# Altium schematic symbol library SignalCommunications.SCHLIB: 804 symbols (part 1 of 9)
Pins are listed as number, name and electrical type; pins without a type are passive.

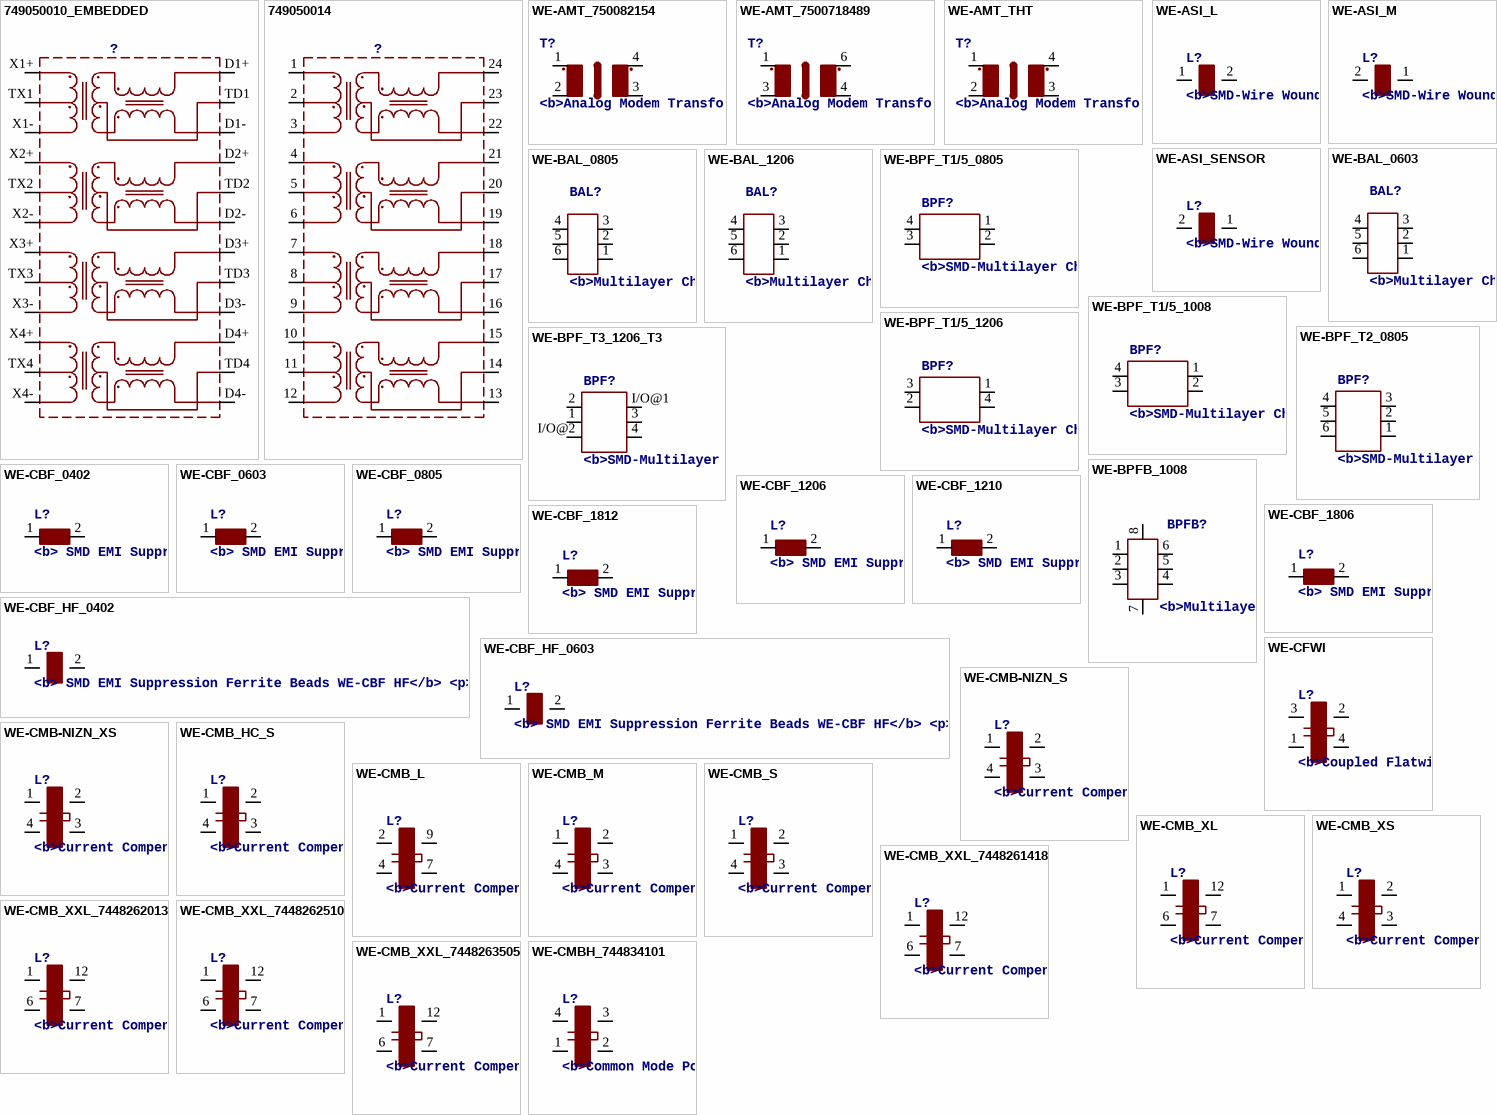
[diagram p0: symbols 749050010_EMBEDDED to WE-CMBH_744834101]

## 749050010_EMBEDDED
designator ?
pins: D1+, D1-, D2+, D2-, D3+, D3-, D4+, D4-, TD1, TD2, TD3, TD4, TX1, TX2, TX3, TX4, X1+, X1-, X2+, X2-, X3+, X3-, X4+, X4-

## 749050014
designator ?
footprint 749050010_A
pins: 1 X1+, 2 TX1, 3 X1-, 4 X2+, 5 TX2, 6 X2-, 7 X3+, 8 TX3, 9 X3-, 10 X4+, 11 TX4, 12 X4-, 13 D4-, 14 TD4, 15 D4+, 16 D3-, 17 TD3, 18 D3+, 19 D2-, 20 TD2, 21 D2+, 22 D1-, 23 TD1, 24 D1+

## WE-AMT_750082154
designator T?, comment <b>Analog Modem Transformer WE-AMT</b><p> / - SMD and THT<br> / - Small size<br> / - Flat profile<br> / - V.90 performance (SmartDAA TM)<br> / - Released for Conexant SmartDAA TM solution<br><br> / -- Analog Modems
footprint WE-AMT_750082154
pins: 1, 2 3, 3 4, 4 6

## WE-AMT_7500718489
designator T?, comment <b>Analog Modem Transformer WE-AMT</b><p> / - SMD and THT<br> / - Small size<br> / - Flat profile<br> / - V.90 performance (SmartDAA TM)<br> / - Released for Conexant SmartDAA TM solution<br><br> / -- Analog Modems
footprint WE-AMT_7500718489
pins: 1, 3, 4, 6

## WE-AMT_THT
designator T?, comment <b>Analog Modem Transformer WE-AMT</b><p> / - SMD and THT<br> / - Small size<br> / - Flat profile<br> / - V.90 performance (SmartDAA TM)<br> / - Released for Conexant SmartDAA TM solution<br><br> / -- Analog Modems
footprint WE-AMT_750082107_750082111_7500718001
pins: 1, 2 3, 3 4, 4 6

## WE-ASI_L
designator L?, comment <b>SMD-Wire Wound Inductor WE-ASI</b><p> / - Specially constructed for sensors and actuators<br> / - Highest possible current in the smallest case size<br> / - High self resonant frequency<br><br> / -- Especially designed for Automation Standard Interface applications
footprint WE-ASI_L
pins: 1, 2

## WE-ASI_M
designator L?, comment <b>SMD-Wire Wound Inductor WE-ASI</b><p> / - Specially constructed for sensors and actuators<br> / - Highest possible current in the smallest case size<br> / - High self resonant frequency<br><br> / -- Especially designed for Automation Standard Interface applications
footprint WE-ASI_M
pins: 1 2, 2 1

## WE-ASI_SENSOR
designator L?, comment <b>SMD-Wire Wound Inductor WE-ASI</b><p> / - Specially constructed for sensors and actuators<br> / - Highest possible current in the smallest case size<br> / - High self resonant frequency<br><br> / -- Especially designed for Automation Standard Interface applications
footprint WE-ASI_SENSOR
pins: 1 2, 2 1

## WE-BAL_0603
designator BAL?, comment <b>Multilayer Chip Baluns WE-BAL</b><p> / - Low loss SMD Balun with balanced impedance of 50 to 200 Ohm<br> / - Operating temperature: -40°C to +85°C<br> / - Power Capacity: 3 W max.<br><br> / -- RF-applications in the area of 0.8 to 6 GHz<br> / -- Download S-Parameter on www.we-online.com<br> / -- Wireless communication systems like DECT, PACS, PHS, GSM, WLAN, Bluetooth
footprint WE-BAL_0603
pins: 1, 2, 3, 4, 5, 6

## WE-BAL_0805
designator BAL?, comment <b>Multilayer Chip Baluns WE-BAL</b><p> / - Low loss SMD Balun with balanced impedance of 50 to 200 Ohm<br> / - Operating temperature: -40°C to +85°C<br> / - Power Capacity: 3 W max.<br><br> / -- RF-applications in the area of 0.8 to 6 GHz<br> / -- Download S-Parameter on www.we-online.com<br> / -- Wireless communication systems like DECT, PACS, PHS, GSM, WLAN, Bluetooth
footprint WE-BAL_0805
pins: 1, 2, 3, 4, 5, 6

## WE-BAL_1206
designator BAL?, comment <b>Multilayer Chip Baluns WE-BAL</b><p> / - Low loss SMD Balun with balanced impedance of 50 to 200 Ohm<br> / - Operating temperature: -40°C to +85°C<br> / - Power Capacity: 3 W max.<br><br> / -- RF-applications in the area of 0.8 to 6 GHz<br> / -- Download S-Parameter on www.we-online.com<br> / -- Wireless communication systems like DECT, PACS, PHS, GSM, WLAN, Bluetooth
footprint WE-BAL_1206
pins: 1, 2, 3, 4, 5, 6

## WE-BPF_T1/5_0805
designator BPF?, comment <b>SMD-Multilayer Chip Band-Pass Filter WE-BPF</b><p> / - low insertion loss<br> / - High attenuation<br> / - Guaranteed filter characteristics over a wide temperature range<p> / -- Rf applications in the frequency range up to 6GHz<br> / -- Wireless communcation systems like DECT, PACS, PHS, GSM,WLAN,Bluetooth,..
footprint WE-BPF_0805_T1
pins: 1 GND, 2 OUT, 3 GND, 4 IN

## WE-BPF_T1/5_1008
designator BPF?, comment <b>SMD-Multilayer Chip Band-Pass Filter WE-BPF</b><p> / - low insertion loss<br> / - High attenuation<br> / - Guaranteed filter characteristics over a wide temperature range<p> / -- Rf applications in the frequency range up to 6GHz<br> / -- Wireless communcation systems like DECT, PACS, PHS, GSM,WLAN,Bluetooth,..
footprint WE-BPF_1008_T5
pins: 1 GND, 2 OUT, 3 GND, 4 IN

## WE-BPF_T1/5_1206
designator BPF?, comment <b>SMD-Multilayer Chip Band-Pass Filter WE-BPF</b><p> / - low insertion loss<br> / - High attenuation<br> / - Guaranteed filter characteristics over a wide temperature range<p> / -- Rf applications in the frequency range up to 6GHz<br> / -- Wireless communcation systems like DECT, PACS, PHS, GSM,WLAN,Bluetooth,..
footprint WE-BPF_1206_T1
pins: 1 GND, 2 GND, 3 IN, 4 OUT

## WE-BPF_T2_0805
designator BPF?, comment <b>SMD-Multilayer Chip Band-Pass Filter WE-BPF</b><p> / - low insertion loss<br> / - High attenuation<br> / - Guaranteed filter characteristics over a wide temperature range<p> / -- Rf applications in the frequency range up to 6GHz<br> / -- Wireless communcation systems like DECT, PACS, PHS, GSM,WLAN,Bluetooth,..
footprint WE-BPF_0805_T2
pins: 1 GND, 2 GND, 3 I/O, 4 GND, 5 GND, 6 I/O

## WE-BPF_T3_1206_T3
designator BPF?, comment <b>SMD-Multilayer Chip Band-Pass Filter WE-BPF</b><p> / - low insertion loss<br> / - High attenuation<br> / - Guaranteed filter characteristics over a wide temperature range<p> / -- Rf applications in the frequency range up to 6GHz<br> / -- Wireless communcation systems like DECT, PACS, PHS, GSM,WLAN,Bluetooth,..
footprint WE-BPF_1206_T3
pins: 1 GND, 2 GND, 3 GND, 4 GND, I/O@1 I/O, I/O@2 I/O

## WE-BPFB_1008
designator BPFB?, comment <b>Multilayer SMD Band-Pass Filter with Balun WE-BPFB</b><br> / <br> / - Low insertion loss<br> / - High attenuation in the stop zone<br> / - Impedance ration 50:100<br> / - Power capacity: 1 W max.<br> / - Operating temperature: -40°C up to +85°C<br><br> / -- 2,4 GHz WLAN<br> / -- Home RF<br> / -- Bluetooth
footprint WE-BPFB_1008
pins: 1 NC, 2 UNBAL.P, 3 NC/DC, 4 BAL.P, 5 NC, 6 BAL.P, 7 GND, 8 GND

## WE-CBF_0402
designator L?, comment <b> SMD EMI Suppression Ferrite Beads WE-CBF</b> <p> / - Excellent anti-EMI properties <br> / - Low DC-restistance <br> / - Impedances till 3000 ohms <br> / - Rated current up to 6 A<p> / -- Reliable Ni-Sn electrodes<br> / -- Perfect as data lined filter and for uncoupling of distribution voltage<br>
footprint 0402
pins: 1, 2

## WE-CBF_0603
designator L?, comment <b> SMD EMI Suppression Ferrite Beads WE-CBF</b> <p> / - Excellent anti-EMI properties <br> / - Low DC-restistance <br> / - Impedances till 3000 ohms <br> / - Rated current up to 6 A<p> / -- Reliable Ni-Sn electrodes<br> / -- Perfect as data lined filter and for uncoupling of distribution voltage<br>
footprint 0603
pins: 1, 2

## WE-CBF_0805
designator L?, comment <b> SMD EMI Suppression Ferrite Beads WE-CBF</b> <p> / - Excellent anti-EMI properties <br> / - Low DC-restistance <br> / - Impedances till 3000 ohms <br> / - Rated current up to 6 A<p> / -- Reliable Ni-Sn electrodes<br> / -- Perfect as data lined filter and for uncoupling of distribution voltage<br>
footprint 0805
pins: 1, 2

## WE-CBF_1206
designator L?, comment <b> SMD EMI Suppression Ferrite Beads WE-CBF</b> <p> / - Excellent anti-EMI properties <br> / - Low DC-restistance <br> / - Impedances till 3000 ohms <br> / - Rated current up to 6 A<p> / -- Reliable Ni-Sn electrodes<br> / -- Perfect as data lined filter and for uncoupling of distribution voltage<br>
footprint 1206
pins: 1, 2

## WE-CBF_1210
designator L?, comment <b> SMD EMI Suppression Ferrite Beads WE-CBF</b> <p> / - Excellent anti-EMI properties <br> / - Low DC-restistance <br> / - Impedances till 3000 ohms <br> / - Rated current up to 6 A<p> / -- Reliable Ni-Sn electrodes<br> / -- Perfect as data lined filter and for uncoupling of distribution voltage<br>
footprint 1210
pins: 1, 2

## WE-CBF_1806
designator L?, comment <b> SMD EMI Suppression Ferrite Beads WE-CBF</b> <p> / - Excellent anti-EMI properties <br> / - Low DC-restistance <br> / - Impedances till 3000 ohms <br> / - Rated current up to 6 A<p> / -- Reliable Ni-Sn electrodes<br> / -- Perfect as data lined filter and for uncoupling of distribution voltage<br>
footprint 1806
pins: 1, 2

## WE-CBF_1812
designator L?, comment <b> SMD EMI Suppression Ferrite Beads WE-CBF</b> <p> / - Excellent anti-EMI properties <br> / - Low DC-restistance <br> / - Impedances till 3000 ohms <br> / - Rated current up to 6 A<p> / -- Reliable Ni-Sn electrodes<br> / -- Perfect as data lined filter and for uncoupling of distribution voltage<br>
footprint 1812
pins: 1, 2

## WE-CBF_HF_0402
designator L?, comment <b> SMD EMI Suppression Ferrite Beads WE-CBF HF</b> <p>
footprint 0402
pins: 1, 2

## WE-CBF_HF_0603
designator L?, comment <b> SMD EMI Suppression Ferrite Beads WE-CBF HF</b> <p>
footprint 0603
pins: 1, 2

## WE-CFWI
designator L?, comment <b>Coupled Flatwire Inductor WE-CFWI</b><p> / - Very low RDC<br> / - Low inductance drift over temperature<br> / - Operating temperature: –40 °C up to +150 °C<br> / - Coupled inductor with two identical windings<br> / - More variants due to parallel and serie connection<p> / -- High power switching regulators<br> / -- 1:1 flyback converter<br> / --  Buck, Boost, Sepic and Cuk Converter<br> / -- Switching regulators with secondary unregulated output voltage<br> / -- Battery Cell Charging Balancer
MANUFACTURER: Würth Elektronik eiSos GmbH; CREATED-BY: Christin Otto; COMPANY-URL: http://we-online.de; CREATED-DATE: August 2013; DATASHEET-URL: http://katalog.we-online.de/de/pbs/WE-CFWI?sid=1d9d32b2a9
footprint WE-CFWI
pins: 1, 2 4, 3, 4 2

## WE-CMB-NIZN_S
designator L?, comment <b>Current Compensated Choke WE-CMB NiZn</b><p> / You can reach high suppressions of asymmetric <br> / interferences at middle and high frequency ranges<br> / - Increases noise immunity with HF-irradiation and burst-signals <br> / - Noise suppression up to 300 MHz<br> / <br> / -- Power electronics<br> / -- Power line in- and output filter<br>
footprint WE-CMB_NIZN_S
pins: 1 3, 2 4, 3 2, 4 1

## WE-CMB-NIZN_XS
designator L?, comment <b>Current Compensated Choke WE-CMB NiZn</b><p> / You can reach high suppressions of asymmetric <br> / interferences at middle and high frequency ranges<br> / - Increases noise immunity with HF-irradiation and burst-signals <br> / - Noise suppression up to 300 MHz<br> / <br> / -- Power electronics<br> / -- Power line in- and output filter<br>
footprint WE-CMB_NIZN_XS
pins: 1 3, 2 4, 3 2, 4 1

## WE-CMB_HC_S
designator L?, comment <b>Current Compensated Choke WE-CMB HC</b><p> / You can reach high suppressions of asymmetric <br> / interferences even at low frequency ranges<br> / - Broadband screening because of anticapacitance coiling technique<br> / - Highest posssible current with small sizes<br> / - High interference comppression asymmetric interlerence rates also at low frequenca range<br> / <br> / -- Power electronics<br> / -- Power line in- and output filter<br> / -- For filtering of devices without a stable ground connection<br> / -- Radio interference suppression in motors
footprint WE-CMB_HC_S
pins: 1 3, 2 4, 3 2, 4 1

## WE-CMB_L
designator L?, comment <b>Current Compensated Choke WE-CMB</b><p> / You can reach high suppressions of asymmetric <br> / interferences even at low frequency ranges<br> / - Broadband screening because of anticapacitance coiling technique<br> / - Highest posssible current with small sizes<br> / - High interference comppression asymmetric interlerence rates also at low frequenca range<br> / <br> / -- Power electronics<br> / -- Power line in- and output filter<br> / -- For filtering of devices without a stable ground connection<br> / -- Radio interference suppression in motors
footprint WE-CMB_L
pins: 2 3, 4 1, 7 2, 9 4

## WE-CMB_M
designator L?, comment <b>Current Compensated Choke WE-CMB</b><p> / You can reach high suppressions of asymmetric <br> / interferences even at low frequency ranges<br> / - Broadband screening because of anticapacitance coiling technique<br> / - Highest posssible current with small sizes<br> / - High interference comppression asymmetric interlerence rates also at low frequenca range<br> / <br> / -- Power electronics<br> / -- Power line in- and output filter<br> / -- For filtering of devices without a stable ground connection<br> / -- Radio interference suppression in motors
footprint WE-CMB_M
pins: 1 3, 2 4, 3 2, 4 1

## WE-CMB_S
designator L?, comment <b>Current Compensated Choke WE-CMB</b><p> / You can reach high suppressions of asymmetric <br> / interferences even at low frequency ranges<br> / - Broadband screening because of anticapacitance coiling technique<br> / - Highest posssible current with small sizes<br> / - High interference comppression asymmetric interlerence rates also at low frequenca range<br> / <br> / -- Power electronics<br> / -- Power line in- and output filter<br> / -- For filtering of devices without a stable ground connection<br> / -- Radio interference suppression in motors
footprint WE-CMB_S
pins: 1 3, 2 4, 3 2, 4 1

## WE-CMB_XL
designator L?, comment <b>Current Compensated Choke WE-CMB</b><p> / You can reach high suppressions of asymmetric <br> / interferences even at low frequency ranges<br> / - Broadband screening because of anticapacitance coiling technique<br> / - Highest posssible current with small sizes<br> / - High interference comppression asymmetric interlerence rates also at low frequenca range<br> / <br> / -- Power electronics<br> / -- Power line in- and output filter<br> / -- For filtering of devices without a stable ground connection<br> / -- Radio interference suppression in motors
footprint WE-CMB_XL
pins: 1 3, 6 1, 7 2, 12 4

## WE-CMB_XS
designator L?, comment <b>Current Compensated Choke WE-CMB</b><p> / You can reach high suppressions of asymmetric <br> / interferences even at low frequency ranges<br> / - Broadband screening because of anticapacitance coiling technique<br> / - Highest posssible current with small sizes<br> / - High interference comppression asymmetric interlerence rates also at low frequenca range<br> / <br> / -- Power electronics<br> / -- Power line in- and output filter<br> / -- For filtering of devices without a stable ground connection<br> / -- Radio interference suppression in motors
footprint WE-CMB_XS
pins: 1 3, 2 4, 3 2, 4 1

## WE-CMB_XXL_7448261418
designator L?, comment <b>Current Compensated Choke WE-CMB</b><p> / You can reach high suppressions of asymmetric <br> / interferences even at low frequency ranges<br> / - Broadband screening because of anticapacitance coiling technique<br> / - Highest posssible current with small sizes<br> / - High interference comppression asymmetric interlerence rates also at low frequenca range<br> / <br> / -- Power electronics<br> / -- Power line in- and output filter<br> / -- For filtering of devices without a stable ground connection<br> / -- Radio interference suppression in motors
footprint WE-CMB_XXL_7448261418
pins: 1 3, 6 1, 7 2, 12 4

## WE-CMB_XXL_7448262013
designator L?, comment <b>Current Compensated Choke WE-CMB</b><p> / You can reach high suppressions of asymmetric <br> / interferences even at low frequency ranges<br> / - Broadband screening because of anticapacitance coiling technique<br> / - Highest posssible current with small sizes<br> / - High interference comppression asymmetric interlerence rates also at low frequenca range<br> / <br> / -- Power electronics<br> / -- Power line in- and output filter<br> / -- For filtering of devices without a stable ground connection<br> / -- Radio interference suppression in motors
footprint WE-CMB_XXL_7448262013
pins: 1 3, 6 1, 7 2, 12 4

## WE-CMB_XXL_7448262510
designator L?, comment <b>Current Compensated Choke WE-CMB</b><p> / You can reach high suppressions of asymmetric <br> / interferences even at low frequency ranges<br> / - Broadband screening because of anticapacitance coiling technique<br> / - Highest posssible current with small sizes<br> / - High interference comppression asymmetric interlerence rates also at low frequenca range<br> / <br> / -- Power electronics<br> / -- Power line in- and output filter<br> / -- For filtering of devices without a stable ground connection<br> / -- Radio interference suppression in motors
footprint WE-CMB_XXL_7448262510
pins: 1 3, 6 1, 7 2, 12 4

## WE-CMB_XXL_7448263505
designator L?, comment <b>Current Compensated Choke WE-CMB</b><p> / You can reach high suppressions of asymmetric <br> / interferences even at low frequency ranges<br> / - Broadband screening because of anticapacitance coiling technique<br> / - Highest posssible current with small sizes<br> / - High interference comppression asymmetric interlerence rates also at low frequenca range<br> / <br> / -- Power electronics<br> / -- Power line in- and output filter<br> / -- For filtering of devices without a stable ground connection<br> / -- Radio interference suppression in motors
footprint WE-CMB_XXL_7448263505
pins: 1 3, 6 1, 7 2, 12 4

## WE-CMBH_744834101
designator L?, comment <b>Common Mode Power Line Choke WE-CMBH</b><p> / You can reach high suppressions of asymmetric <br> / interferences even at low frequency ranges<br> / <b>- Horizontal design for compact housings</b><br> / - Suppression even at low frequency ranges<br> / - Broadband filtering because of low capacitance winding technique <bR> / - Highest possible currents with small sizes<br> / <br> / -- Power electronics<br> / -- Power line in- and output filter<br> / -- Radio interference suppression in motors<br> / -- Suppression of common mode noise
footprint WE-CMBH_1.5MM
pins: 1, 2, 3 4, 4 3

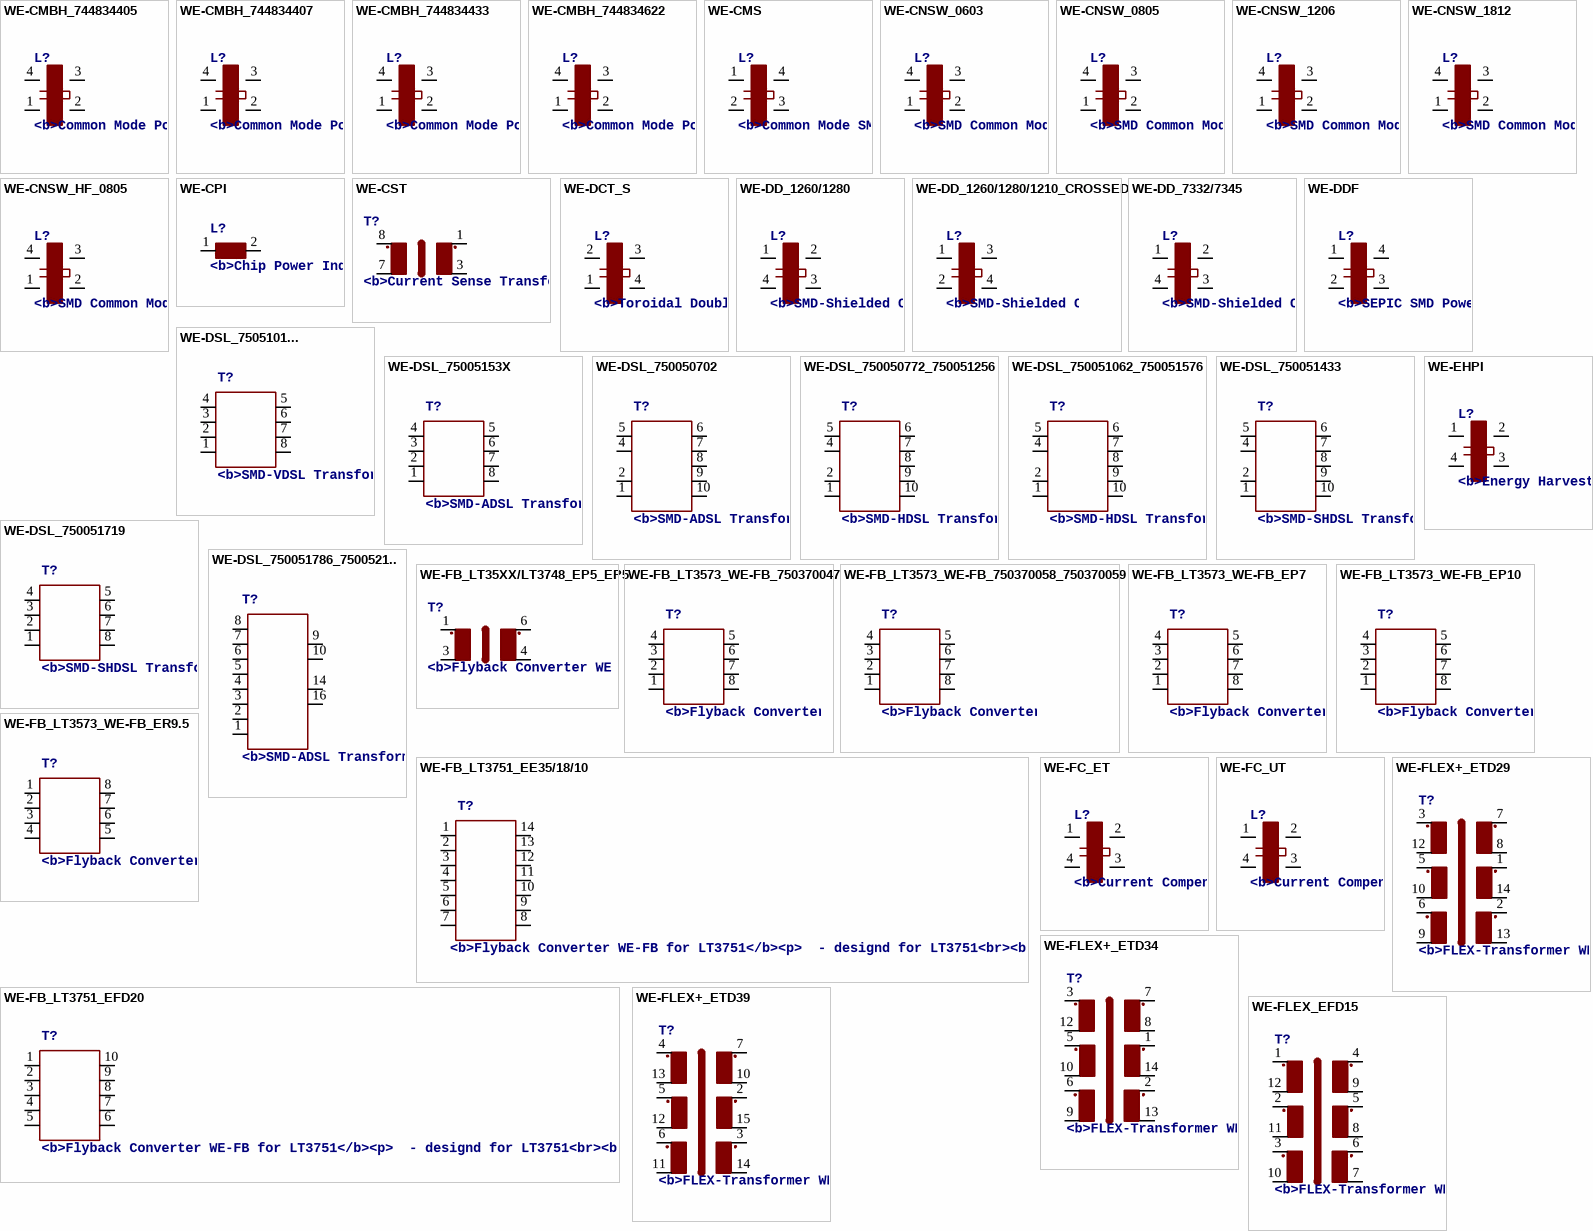
[diagram p1: symbols WE-CMBH_744834405 to WE-FLEX_EFD15]

## WE-CMBH_744834405
designator L?, comment <b>Common Mode Power Line Choke WE-CMBH</b><p> / You can reach high suppressions of asymmetric <br> / interferences even at low frequency ranges<br> / <b>- Horizontal design for compact housings</b><br> / - Suppression even at low frequency ranges<br> / - Broadband filtering because of low capacitance winding technique <bR> / - Highest possible currents with small sizes<br> / <br> / -- Power electronics<br> / -- Power line in- and output filter<br> / -- Radio interference suppression in motors<br> / -- Suppression of common mode noise
footprint WE-CMBH_1.2MM
pins: 1, 2, 3 4, 4 3

## WE-CMBH_744834407
designator L?, comment <b>Common Mode Power Line Choke WE-CMBH</b><p> / You can reach high suppressions of asymmetric <br> / interferences even at low frequency ranges<br> / <b>- Horizontal design for compact housings</b><br> / - Suppression even at low frequency ranges<br> / - Broadband filtering because of low capacitance winding technique <bR> / - Highest possible currents with small sizes<br> / <br> / -- Power electronics<br> / -- Power line in- and output filter<br> / -- Radio interference suppression in motors<br> / -- Suppression of common mode noise
footprint WE-CMBH_1.2MM
pins: 1, 2, 3 4, 4 3

## WE-CMBH_744834433
designator L?, comment <b>Common Mode Power Line Choke WE-CMBH</b><p> / You can reach high suppressions of asymmetric <br> / interferences even at low frequency ranges<br> / <b>- Horizontal design for compact housings</b><br> / - Suppression even at low frequency ranges<br> / - Broadband filtering because of low capacitance winding technique <bR> / - Highest possible currents with small sizes<br> / <br> / -- Power electronics<br> / -- Power line in- and output filter<br> / -- Radio interference suppression in motors<br> / -- Suppression of common mode noise
footprint WE-CMBH_1.2MM
pins: 1, 2, 3 4, 4 3

## WE-CMBH_744834622
designator L?, comment <b>Common Mode Power Line Choke WE-CMBH</b><p> / You can reach high suppressions of asymmetric <br> / interferences even at low frequency ranges<br> / <b>- Horizontal design for compact housings</b><br> / - Suppression even at low frequency ranges<br> / - Broadband filtering because of low capacitance winding technique <bR> / - Highest possible currents with small sizes<br> / <br> / -- Power electronics<br> / -- Power line in- and output filter<br> / -- Radio interference suppression in motors<br> / -- Suppression of common mode noise
footprint WE-CMBH_1.5MM
pins: 1, 2, 3 4, 4 3

## WE-CMS
designator L?, comment <b>Common Mode SMD Bead WE-CMA</b><p> / - Maximum current capability up to 5 A<br> / - Impedances up to 200 ohms<br> / - Low DC resistance with 3 mohms<p> / -- Power supply systems<br> / -- Symmetric data line
footprint WE-CMS_7427521
pins: 1 3, 2 1, 3 2, 4

## WE-CNSW_0603
designator L?, comment <b>SMD Common Mode Noise Suppressor WE-CNSW</b><p> / - High common mode suppression at high frequency<br> / - Small influence for high speed signals through winding symmetry<br><br> / -- USB 2.0<br> / -- Firewire / IEEE 1394 <br> / -- Power supply systems<br> / -- High Speed Data Lines<br> / -- Common mode data line filter
footprint WE-CNSW_0603
pins: 1, 2, 3 4, 4 3

## WE-CNSW_0805
designator L?, comment <b>SMD Common Mode Noise Suppressor WE-CNSW</b><p> / - High common mode suppression at high frequency<br> / - Small influence for high speed signals through winding symmetry<br><br> / -- USB 2.0<br> / -- Firewire / IEEE 1394 <br> / -- Power supply systems<br> / -- High Speed Data Lines<br> / -- Common mode data line filter
footprint WE-CNSW_0805
pins: 1, 2, 3 4, 4 3

## WE-CNSW_1206
designator L?, comment <b>SMD Common Mode Noise Suppressor WE-CNSW</b><p> / - High common mode suppression at high frequency<br> / - Small influence for high speed signals through winding symmetry<br><br> / -- USB 2.0<br> / -- Firewire / IEEE 1394 <br> / -- Power supply systems<br> / -- High Speed Data Lines<br> / -- Common mode data line filter
footprint WE-CNSW_1206
pins: 1, 2, 3 4, 4 3

## WE-CNSW_1812
designator L?, comment <b>SMD Common Mode Noise Suppressor WE-CNSW</b><p> / - High common mode suppression at high frequency<br> / - Small influence for high speed signals through winding symmetry<br><br> / -- USB 2.0<br> / -- Firewire / IEEE 1394 <br> / -- Power supply systems<br> / -- High Speed Data Lines<br> / -- Common mode data line filter
footprint WE-CNSW_1812
pins: 1, 2, 3 4, 4 3

## WE-CNSW_HF_0805
designator L?, comment <b>SMD Common Mode Noise Suppressor WE-CNSW HF</b><p> / - High common mode suppression at high frequency<br> / - Small influence for high speed signals through winding symmetry<br> / - Suitable for high data rates<br><br> / -- USB 3.0<br> / -- Firewire / IEEE 1394 <br> / -- HDMI<br> / -- High Speed Data Lines<br> / -- LVDS<br> / -- Common mode data line filter
footprint WE-CNSW_0805
pins: 1, 2, 3 4, 4 3

## WE-CPI
designator L?, comment <b>Chip Power Inductor WE-CPI</b><br><br> / - Extremely flat power inductor <= 1,1 mm<br> / - High current capability<br><br> / -- Portable power like PDA, digital camera, / PCMICA-cards and displays<br> / -- DC/DC-converter<br> / -- Recommended for switching regulator IC's from / Linear Technology, National Semiconductor, / Texas Instruments and Fairchild Semiconductor
footprint WE-CPI_744011...
pins: 1, 2

## WE-CST
designator T?, comment <b>Current Sense Transformer WE-CST</b><p> / - Height 5.33 mm max.<br> / - Frequency 50 kHz to 1 MHz<br> / - Primary current rating up to 10 A<br><br> / -- AC current detection<br> / -- Switch mode power supply
footprint WE-CST
pins: 1 6, 3 4, 7 3, 8 1

## WE-DCT_S
designator L?, comment <b>Toroidal Double Power Choke WE-DCT</b><br><br> / - very low RDC<br> / - very low core losses<br> / - saturation current higher up to 120A<br> / - low inductance drift over temerature<br> / - low laekage due to bifilar winding<br><br> / -- high power switching regulators<br> / -- solar inverter<br> / -- 1:1 flyback converter<br> / -- buck, bust, sepic and CUK converter
footprint WE-DCT
pins: 1, 2 3, 3 4, 4 2

## WE-DD_1260/1280
designator L?, comment <b>SMD-Shielded Coupled Inductor WE-DD </b><p> / - 1:1 transformer <br> / - Double inductor with two identical windings<br> / - Straight and crossed pin layout available<br> / - Customer specific designs available upon request<p> / -- for SEPIC and CUK topologies<br> / -- Flyback applications<br> / -- Switching regulators with second, unregulated output voltag
footprint WE-DD_1260/1280
pins: 1 3, 2 4, 3 2, 4 1

## WE-DD_1260/1280/1210_CROSSED
designator L?, comment <b>SMD-Shielded Coupled Inductor WE-DD </b><p> / - 1:1 transformer <br> / - Double inductor with two identical windings<br> / - Straight and crossed pin layout available<br> / - Customer specific designs available upon request<p> / -- for SEPIC and CUK topologies<br> / -- Flyback applications<br> / -- Switching regulators with second, unregulated output voltag
footprint WE-DD_12XX_CROSSED
pins: 1 3, 2 1, 3 4, 4 2

## WE-DD_7332/7345
designator L?, comment <b>SMD-Shielded Coupled Inductor WE-DD </b><p> / - 1:1 transformer <br> / - Double inductor with two identical windings<br> / - Straight and crossed pin layout available<br> / - Customer specific designs available upon request<p> / -- for SEPIC and CUK topologies<br> / -- Flyback applications<br> / -- Switching regulators with second, unregulated output voltag
footprint WE-DD_7332/7345
pins: 1 3, 2 4, 3 2, 4 1
